# Altium integrated library Altium_Library_Harish.IntLib: 425 symbols (part 2 of 4) (continued)
## IC_RS512M32LZ4D2ANP-75BT (continued)

## IC_RTL8211E-VB-CG
designator U?, comment RTL8211E-VB-CG
Ethernet Transceivers 10/100/1000 Base-T PHY GMII, MII, RGMII 1.43V ~ 3.63V QFN-48_6x6x04P Ethernet ICs RoHS; Manufacturer: Realtek Semicon; Manufacturer Part Number: RTL8211E-VB-CG; Case/Package: QFN-48; Supplier-1: LCSC
footprint QFN48_19.6_324X324_SMD (QFN Package)
pins: 1 MDI0_P, 2 MDI0_N, 3 AVDD10_1, 4 MDI1_P, 5 MDI1_N, 6 AVDD33_1, 7 MDI2_P, 8 MDI2_N, 9 AVDD10_2, 10 MDI3_P, 11 MD3_N, 12 NC1, 13 RXCTL/PHY_AD2, 14 RXD0/SELRGV, 15 DVDD33_1, 16 RXD1/TXDLY, 17 RXD2/AIN0, 18 RXD3/AIN1, 19 RXC, 20 INT, 21 DVDD33_2, 22 TXC, 23 TXD0, 24 TXD1, 25 TXD2, 26 TXD3, 27 TXCTL, 28 DVDD10_2, 29 PHY_NRST, 30 MDC, 31 MDIO, 32 LED2/RXDLY, 33 PME, 34 LED0/PHY_AD0, 35 LED1/PHY_AD1, 36 DVDD10_1, 37 DVDD33_3, 38 ENSWREG, 39 RSET, 40 AVDD10_3, 41 AVDD33_2, 42 CKXTAL1, 43 CKXTAL2, 44 VDDREG_1, 45 VDDREG_2, 46 CLK125, 47 GND1, 48 REG_OUT, 49 EXPAD1

## IC_S32K116_MCU
designator U?, comment FS32K116LAT0MLFT
MCU 32-Bit S32K116 ARM Cortex-M0+ RISC 128KB Flash 2.7V to 5.5V 48-Pin LQFP Tray; Manufacturer: NXP Semiconductors; Supplier 1: Digi-Key; Manufacturer Part Number: FS32K116LAT0MLFT; RoHS: Yes; Category: Microcontrollers; Stock 1: 1; Pricing 1: 1=23.54, 10=18.877, 80=16.11963, 500=15.9075 (USD); Supplier Part Number 1: 568-14729-ND
footprint S32K116_48PIN
pins: 1 PTD1, 2 PTD0, 3 PTE5, 4 PTE4, 5 VDD5, 6 VDDA, 7 VSS7, 8 PTB7, 9 PTB6, 10 PTD16, 11 PTD15, 12 PTE9, 13 PTE8, 14 PTB5, 15 PTB4, 16 PTC3, 17 PTC2, 18 PTD5, 19 PTC1, 20 PTC16, 21 PTC15, 22 PTC14, 23 PTB3, 24 PTB2, 25 PTB1, 26 PTB0, 27 PTC9, 28 PTC8, 29 PTA7, 30 VSS30, 31 VDD31, 32 PTB13, 33 PTD3, 34 PTD2, 35 PTA3, 36 PTA2, 37 PTA1, 38 PTA0, 39 PTC7, 40 PTC6, 41 PTA13, 42 PTA12, 43 PTA11, 44 PTA10, 45 PTC5, 46 PTC4, 47 PTA5, 48 PTA4
text: S32K116

## IC_S32K144_MCU
designator U?
footprint LQFP_64 (S32K144 0.5mm Pitch)
pins: 1 PTD1, 2 PTD0, 3 PTE11, 4 PTE10, 5 PTE5, 6 PTE4, 7 VDD, 8 VDDA, 9 VREFH, 10 VSS, 11 PTB7, 12 PTB6, 13 PTE3, 14 PTD16, 15 PTD15, 16 PTE9, 17 PTE8, 18 PTB5, 19 PTB4, 20 PTC3, 21 PTC2, 22 PTD7, 23 PTD6, 24 PTD5, 25 PTC1, 26 PTC0, 27 PTC17, 28 PTC16, 29 PTC15, 30 PTC14, 31 PTB3, 32 PTB2, 33 PTB1, 34 PTB0, 35 PTC9, 36 PTC8, 37 PTA7, 38 PTA6, 39 PTE7, 40 VSS, 41 VDD, 42 PTB13, 43 PTB12, 44 PTD4, 45 PTD3, 46 PTD2, 47 PTA3, 48 PTA2, 49 PTA1, 50 PTA0, 51 PTC7, 52 PTC6, 53 PTE6, 54 PTE2, 55 PTA13, 56 PTA12, 57 PTA11, 58 PTA10, 59 PTE1, 60 PTE0, 61 PTC5, 62 PTC4, 63 PTA5, 64 PTA4
text: S32K144

## IC_SN74HCT14 SChmit-Trigger Inverter 6 Channel 16TSSOP
designator U?  (value not drawn)
IC INV SCHMITT 6CH 1-IN 14SOIC
footprint SO-14_1.27 IC SN74HCT14
pins: 1 1A "Channel 1 Input", 2 1Y "Channel 1 Output", 3 2A "Channel 2 Input", 4 2Y "Channel 2 Output", 5 3A "Channel 3 Input", 6 3Y "Channel 3 Output", 7 GND "Ground", 8 4Y "Channel 4 Output", 9 4A "Channel 4 Input", 10 5Y "Channel 5 Output", 11 5A "Channel 5 Input", 12 6Y "Channel 6 Output", 13 6A "Channel 6 Input", 14 VCC "Power Supply"
text: SN74HCT14

## IC_SOC_40QN40K15050_0.4mm-Pitch_QFN40
designator SC?, comment 40QN40S15050
Plastronics IC Test & Burn-In Socket, For QFN40, MLP40, MLF40 Package; Manufacturer: Plastronics; ComponentLink1Description: Purchase link; ComponentLink1URL: https://www.waveshare.com/40qn40s15050.htm
footprint IC_SOCKET_QFN40_40QN40K15050 (Socket Programming QFN40)
pins: 1 WDI, 2 SDA, 3 SCL, 4 VDDIO, 5 VDDOTP, 6 PWRON, 7 STANDBY, 8 ONKEY, 9 INTB, 10 RESETBMCU, 11 VLDO3IN, 12 VLDO3, 13 SW3LX, 14 SW3IN, 15 SW3FB, 16 SW2FB, 17 SW2IN, 18 SW2LX, 19 VLDO2, 20 VLDO2IN, 21 VREFDDR, 22 VINREFDDR, 23 VDIG, 24 VCORE, 25 SW1LX, 26 SW1IN, 27 SW1FB, 28 VLDO1IN, 29 VLDO1, 30 VSNVS, 31 LICELL, 32 THM, 33 VBATT1, 34 VBATT2, 35 VSYS1, 36 VSYS2, 37 VBUSIN, 38 INT2P7, 39 USBPHY, 40 CHGB, 41 PAD
text: PF1550 Socket

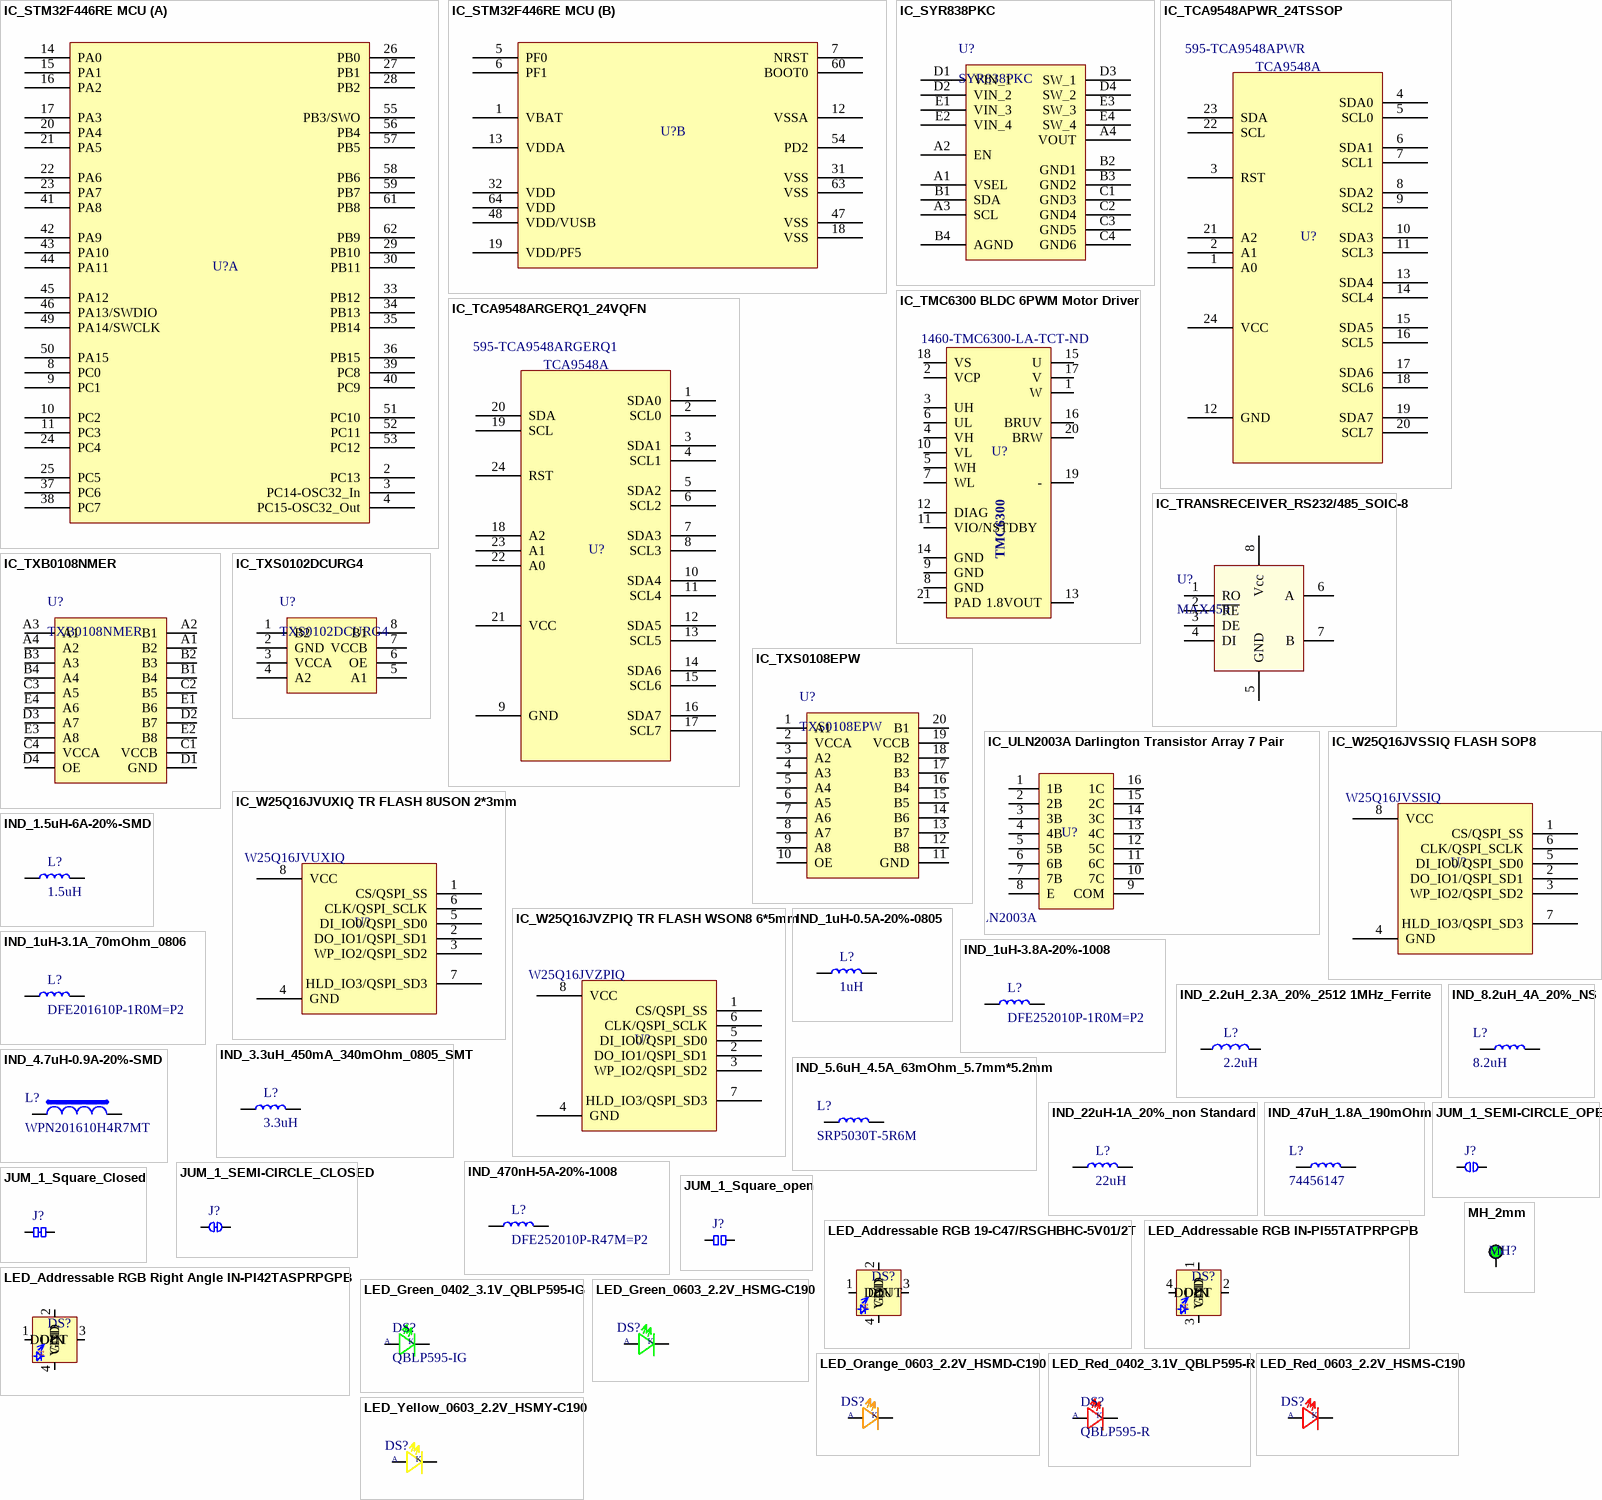
[diagram p10: symbols IC_STM32F446RE MCU to MH_2mm]

## IC_STM32F446RE MCU
designator U?  (value not drawn)
ARM® Cortex®-M4 STM32 F4 Microcontroller IC 32-Bit 180MHz 512KB (512K x 8) FLASH 64-LQFP (10x10)
part A pins: 2 PC13, 3 PC14-OSC32_In, 4 PC15-OSC32_Out, 8 PC0, 9 PC1, 10 PC2, 11 PC3, 14 PA0, 15 PA1, 16 PA2, 17 PA3, 20 PA4, 21 PA5, 22 PA6, 23 PA7, 24 PC4, 25 PC5, 26 PB0, 27 PB1, 28 PB2, 29 PB10, 30 PB11, 33 PB12, 34 PB13, 35 PB14, 36 PB15, 37 PC6, 38 PC7, 39 PC8, 40 PC9, 41 PA8, 42 PA9, 43 PA10, 44 PA11, 45 PA12, 46 PA13/SWDIO, 49 PA14/SWCLK, 50 PA15, 51 PC10, 52 PC11, 53 PC12, 55 PB3/SWO, 56 PB4, 57 PB5, 58 PB6, 59 PB7, 61 PB8, 62 PB9
part B pins: 1 VBAT, 5 PF0, 6 PF1, 7 NRST, 12 VSSA, 13 VDDA, 18 VSS, 19 VDD/PF5, 31 VSS, 32 VDD, 47 VSS, 48 VDD/VUSB, 54 PD2, 60 BOOT0, 63 VSS, 64 VDD

## IC_SYR838PKC
designator U?, comment SYR838PKC
Step-Down Positive Programmable 1 6A 2.4MHz CSP1.56*1.96-20 DC-DC Converters RoHS; Manufacturer: Silergy Corp; Manufacturer Part Number: SYR838PKC; Case/Package: CSP1.56*1.96-20; Supplier-1: LCSC
footprint CSP20_15.7_100x84_SMD (CSP Package)
pins: A1 VSEL, A2 EN, A3 SCL, A4 VOUT, B1 SDA, B2 GND1, B3 GND2, B4 AGND, C1 GND3, C2 GND4, C3 GND5, C4 GND6, D1 VIN_1, D2 VIN_2, D3 SW_1, D4 SW_2, E1 VIN_3, E2 VIN_4, E3 SW_3, E4 SW_4

## IC_TCA9548APWR_24TSSOP
designator U?  Supplier Part Number 1: 595-TCA9548APWR  (hidden comment: *)
IC I2C SW 8CH W/RESET 24TSSOP; Manufacturer: Texas Instruments; Manufacturer Part Number: TCA9548APWR; Max Supply Voltage: 5.5V; Min Supply Voltage: 1.65V; Max Supply Current: 80uA; Supply Type: Single; Independent Circuits: 1; Supplier 1: Mouser; RoHS: Yes; Category: Decoders and Multiplexers; Stock 1: 37474; Pricing 1: 1=1.63, 10=1.46, 50=1.46, 100=1.14, 1000=0.742, 10000=0.638 (USD); Mount: Surface Mount; Case/Package: TSSOP; Number of Pins: 24; Min Operating Temperature: -40°C; Max Operating Temperature: 85°C; Packaging: Tape and Reel; Package Quantity: 2000; Series: TCA; Reach SVHC Compliant: No; Lead Free: Lead Free; RoHS Compliant: Yes; ComponentLink1URL: https://datasheet.ciiva.com/6614/tca9548a-6614721.pdf?src-supplier=Digi-Key; ComponentLink1Description: https://datasheet.ciiva.com/6614/tca9548a-6614721.pdf?src-supplier=Digi-Key
pins: 1 A0, 2 A1, 3 RST, 4 SDA0, 5 SCL0, 6 SDA1, 7 SCL1, 8 SDA2, 9 SCL2, 10 SDA3, 11 SCL3, 12 GND, 13 SDA4, 14 SCL4, 15 SDA5, 16 SCL5, 17 SDA6, 18 SCL6, 19 SDA7, 20 SCL7, 21 A2, 22 SCL, 23 SDA, 24 VCC
text: TCA9548A

## IC_TCA9548ARGERQ1_24VQFN
designator U?  Supplier Part Number 1: 595-TCA9548ARGERQ1  (hidden comment: *)
I2C Switch with Reset 8 Channel Bi-Directional 1.65V to 5.25V 24-Pin VQFN Cut Tape; Manufacturer: Texas Instruments; Manufacturer Part Number: TCA9548ARGERQ1; Supplier 1: Mouser; RoHS: Yes; Category: Decoders and Multiplexers; Stock 1: 161025; Pricing 1: 1=2.33, 10=2, 50=2, 100=1.6, 1000=1.15, 10000=1.02 (USD); ComponentLink1URL: http://www.ti.com/general/docs/suppproductinfo.tsp?distId=10&amp;gotoUrl=http%3A%2F%2Fwww.ti.com%2Flit%2Fgpn%2Ftca9548a-q1&src-supplier=Digi-Key; ComponentLink1Description: http://www.ti.com/general/docs/suppproductinfo.tsp?distId=10&amp;gotoUrl=http%3A%2F%2Fwww.ti.com%2Flit%2Fgpn%2Ftca9548a-q1&src-supplier=Digi-Key
pins: 1 SDA0, 2 SCL0, 3 SDA1, 4 SCL1, 5 SDA2, 6 SCL2, 7 SDA3, 8 SCL3, 9 GND, 10 SDA4, 11 SCL4, 12 SDA5, 13 SCL5, 14 SDA6, 15 SCL6, 16 SDA7, 17 SCL7, 18 A2, 19 SCL, 20 SDA, 21 VCC, 22 A0, 23 A1, 24 RST
text: TCA9548A

## IC_TMC6300 BLDC 6PWM Motor Driver
designator U?  Supplier Part Number 1: 1460-TMC6300-LA-TCT-ND  (hidden comment: *)
BLDC Motor Driver IC, 2.0A, 2...11V, QFN-20; Manufacturer: Trinamic; Manufacturer Part Number: TMC6300-LA-T; Supplier 1: Digi-Key; RoHS: No; Stock 1: 4327; Pricing 1: 1=2.56, 10=2.303, 25=2.1728, 100=1.8514, 250=1.7384, 500=1.5211, 1000=1.26034, 2500=1.23 (USD)
footprint QFN20_0.4mm 5x5 TMC6300
pins: 1 W, 2 VCP, 3 UH, 4 VH, 5 WH, 6 UL, 7 WL, 8 GND, 9 GND, 10 VL, 11 VIO/NSTDBY, 12 DIAG, 13 1.8VOUT, 14 GND, 15 U, 16 BRUV, 17 V, 18 VS, 19 -, 20 BRW, 21 PAD
text: TMC6300

## IC_TRANSRECEIVER_RS232/485_SOIC-8
designator U?, comment MAX458
1/1 Transceiver Half RS422, RS485 8-SOIC; Manufacturer: Maxim; Manufacturer Part Number: MAX485ESA+T; Number of Receivers: 1; Operating Supply Voltage: 5V; Data Rate: 2.5Mbps; Interface: RS-422,RS-485; Min Supply Voltage: 4.75V; Max Supply Voltage: 5.25V; Simplex/Duplex: Half Duplex; Supply Current: 500uA; Supplier 1: Digikey; RoHS: Yes; Category: RS-232 / RS-422 / RS-485 Interface ICs; Stock 1: 3430; Pricing 1: 1=5.6, 10=5.033, 25=4.758, 100=4.1235, 250=3.91208, 500=3.5103, 1000=2.96049 (USD); Mount: Surface Mount; Case/Package: SOIC; Number of Pins: 8; Min Operating Temperature: 0°C; Max Operating Temperature: 70°C; Packaging: Tape and Reel; Package Quantity: 1; Number of Transmitters: 1; Logic Function: Transceiver; Number of Drivers: 1; Number of Transceivers: 1; Series: -; Length: 5mm; Width: 4mm; Height: 1.5mm; Lead Free: Lead Free; RoHS Compliant: Yes; Reach SVHC Compliant: Unknown; ComponentLink1URL: https://datasheet.ciiva.com/22828/0900766b810e2699-22828311.pdf?src-supplier=Rs; ComponentLink1Description: https://datasheet.ciiva.com/22828/0900766b810e2699-22828311.pdf?src-supplier=Rs; ComponentLink2URL: https://datasheet.ciiva.com/12260/max1487-max491-96074-12260683.pdf?src-supplier=Mouser; ComponentLink2Description: https://datasheet.ciiva.com/12260/max1487-max491-96074-12260683.pdf?src-supplier=Mouser; ComponentLink3URL: https://datasheet.ciiva.com/14430/max1487-max491-14430326.pdf?src-supplier=Avnet; ComponentLink3Description: https://datasheet.ciiva.com/14430/max1487-max491-14430326.pdf?src-supplier=Avnet; ComponentLink4URL: https://datasheet.ciiva.com/14084/max1487-max491-14084901.pdf?src-supplier=Digikey; ComponentLink4Description: https://datasheet.ciiva.com/14084/max1487-max491-14084901.pdf?src-supplier=Digikey; Supplier Part Number 1: MAX485ESA+TCT-ND
footprint SOIC8 (LV14360)
pins: 1 RO, 2 ~{RE}, 3 DE, 4 DI, 5 GND, 6 A, 7 B, 8 Vcc

## IC_TXB0108NMER
designator U?, comment TXB0108NMER
Translation - Voltage Levels 8-Bit Bidirectional Voltage-Level Shifter with Auto Direction Sensing and +/-15-kV ESD Protect; Manufacturer: Texas Instruments; Manufacturer Part Number: TXB0108NMER; Case/Package: NFBGA-20; Supplier-1: Mouser
footprint NFBGA_31.4_125.9X102.36 (BGA, 20-Leads, Body 3.00x2.50mmx0.80mm, Pitch 0.50mm)
pins: A1 B2, A2 B1, A3 A1, A4 A2, B1 B4, B2 B3, B3 A3, B4 A4, C1 VCCB, C2 B5, C3 A5, C4 VCCA, D1 GND, D2 B7, D3 A7, D4 OE, E1 B6, E2 B8, E3 A8, E4 A6

## IC_TXS0102DCURG4
designator U?, comment TXS0102DCURG4
Voltage Level Translator Bidirectional 1 Circuit 2 Channel 24Mbps 8-VSSOP; Manufacturer: Texas Instruments; Manufacturer Part Number: TXS0102DCURG4; Case/Package: VSSOP8; Supplier-1: Mouser
footprint VSSOP-8_19.6_157_33X11_SMD (VSSOP)
pins: 1 B2, 2 GND, 3 VCCA, 4 A2, 5 A1, 6 OE, 7 VCCB, 8 B1

## IC_TXS0108EPW
designator U?, comment TXS0108EPW
TXS0108E 8-Bit Bi-directional, Level-Shifting, Voltage Translator / for Open-Drain and Push-Pull Applications; Manufacturer: Texas Instruments; Alternate Part Number-1: NA; Manufacturer Part Number: TXS0108EPW; Case/Package: TSSOP-20; Supplier-1: Mouser; Supplier Part Number-1: 595-TXS0108EPWRG4; Category: Integrated Circuit; Number of Pins: 20
footprint TSSOP20_25-59_292_12X65_SMT (Footprint not found)
pins: 1 A1, 2 VCCA, 3 A2, 4 A3, 5 A4, 6 A5, 7 A6, 8 A7, 9 A8, 10 OE, 11 GND, 12 B8, 13 B7, 14 B6, 15 B5, 16 B4, 17 B3, 18 B2, 19 VCCB, 20 B1

## IC_ULN2003A Darlington Transistor Array 7 Pair
designator U?  (value not drawn)
IC PWR RELAY 7NPN 1:1 16SO
footprint SO-16_1.27 IC ULN200xA
pins: 1 1B "Input Pair 1", 2 2B "Input Pair 2", 3 3B "Input Pair 3", 4 4B "Input Pair 4", 5 5B "Input Pair 5", 6 6B "Input Pair 6", 7 7B "Input Pair 7", 8 E "Common Emitter (Ground)", 9 COM "Common Clamp Diodes", 10 7C "Output Pair 7", 11 6C "Output Pair 6", 12 5C "Output Pair 5", 13 4C "Output Pair 4", 14 3C "Output Pair 3", 15 2C "Output Pair 2", 16 1C "Output Pair 1"
text: ULN2003A

## IC_W25Q16JVSSIQ FLASH SOP8
designator U?  (value not drawn)
ICFLASH16MBIT133MHZ8SOIC; Manufacturer: Winbond; Manufacturer Part Number: W25Q16JVSSIQ; Memory Type: Non-Volatile,FLASH; Memory Size: 16Mb; Frequency: 133MHz; Supplier 1: Digi-Key; RoHS: Yes; Category: Flash; Stock 1: 347069; Pricing 1: 1=0.5, 25=0.4528, 100=0.3959, 2500=0.37926, 10000=0.34104 (USD); Mount: Surface Mount; Case/Package: SOIC; Min Operating Temperature: -40°C; Max Operating Temperature: 85°C; Packaging: Rail/Tube; Series: SpiFlash®; RoHS Compliant: Yes; ComponentLink1URL: http://www.winbond.com/resource-files/w25q16jv%20spi%20revg%2003222018%20plus.pdf?src-supplier=Digi-Key; ComponentLink1Description: http://www.winbond.com/resource-files/w25q16jv%20spi%20revg%2003222018%20plus.pdf?src-supplier=Digi-Key
footprint SOP8_flash
pins: 1 CS/QSPI_SS, 2 DO_IO1/QSPI_SD1, 3 WP_IO2/QSPI_SD2, 4 GND, 5 DI_IO0/QSPI_SD0, 6 CLK/QSPI_SCLK, 7 HLD_IO3/QSPI_SD3, 8 VCC

## IC_W25Q16JVUXIQ TR FLASH 8USON 2*3mm
designator U?  (value not drawn)
NOR Flash Serial (SPI, Dual SPI, Quad SPI) 3V/3.3V 16M-bit 2M x 8 6ns 8-Pin USON EP T/R; Manufacturer 1: Winbond; Manufacturer Part Number 1: W25Q16JVUXIQ TR; Supplier 1: Digi-Key; RoHS: No; Category: Memory; Stock 1: 22409; Pricing 1: 1=0.56, 10=0.51, 25=0.504, 50=0.501, 100=0.4479, 250=0.44416, 500=0.43758, 1000=0.42193 (USD); Supplier Part Number 1: 256-W25Q16JVUXIQTRCT-ND
footprint USON8 2*3mm
pins: 1 CS/QSPI_SS, 2 DO_IO1/QSPI_SD1, 3 WP_IO2/QSPI_SD2, 4 GND, 5 DI_IO0/QSPI_SD0, 6 CLK/QSPI_SCLK, 7 HLD_IO3/QSPI_SD3, 8 VCC
text: W25Q16JVUXIQ

## IC_W25Q16JVZPIQ TR FLASH WSON8 6*5mm
designator U?  (value not drawn)
NOR Flash Serial-SPI 3V/3.3V 16M-bit 6ns 8-Pin WSON EP Tube | IC FLASH 16M SPI 133MHZ 8WSON; Manufacturer: Winbond; Manufacturer Part Number: W25Q16JVZPIQ; Memory Type: Non-Volatile,FLASH; Memory Size: 16Mb; Supplier 1: Rs; RoHS: Yes; Category: Flash; Stock 1: 1; Mount: Surface Mount; Min Operating Temperature: -40°C; Max Operating Temperature: 85°C; Packaging: Rail/Tube; Frequency: 133MHz; Series: SpiFlash®; RoHS Compliant: Yes; ComponentLink1URL: http://www.winbond.com/resource-files/w25q16jv%20spi%20revg%2003222018%20plus.pdf?src-supplier=Digi-Key; ComponentLink1Description: http://www.winbond.com/resource-files/w25q16jv%20spi%20revg%2003222018%20plus.pdf?src-supplier=Digi-Key
footprint WSON8 6*5mm 8 PAD
pins: 1 CS/QSPI_SS, 2 DO_IO1/QSPI_SD1, 3 WP_IO2/QSPI_SD2, 4 GND, 5 DI_IO0/QSPI_SD0, 6 CLK/QSPI_SCLK, 7 HLD_IO3/QSPI_SD3, 8 VCC

## IND_1.5uH-6A-20%-SMD
designator L?, comment 1.5uH
WPN4020H1R5MT / Wire Wound SMD Power Inductors – WPN Series / Operating Temp. : -40℃~+125℃ (Including self-heating) /; Manufacturer: Sunlord; Mnaufcaturer Part Number: WPN4020H1R5MT; Case/Package: SMD; Supplier-1: NA
pins: 1, 2 1

## IND_1uH-0.5A-20%-0805
designator L?, comment 1uH
1uH ±20% 500mA 150mΩ 0805 Inductors (SMD) RoHS /; Manufacturer: Taiyo Yuden; Manufacturer Part Number: CB2012T1R0M; Case/Package: 0805; Supplier-1: LCSC
pins: 1, 2 1

## IND_1uH-3.1A_70mOhm_0806
designator L?, comment DFE201610P-1R0M=P2
Inductor Power Shielded Wirewound 1uH 20% 1MHz Metal 2.2A 0.07Ohm DCR 0806 T/R; Manufacturer: Murata Electronics; Manufacturer 1: Murata; Core Material: Ferrite; Current Rating: 3.1A; DC Resistance (DCR): 70mR; Manufacturer Part Number: DFE201610P-1R0M=P2; Case/Package: 0806; Supplier-1: Digikey; Supplier 1: Digi-Key; Manufacturer Part Number 1: DFE201610P-1R0M=P2; RoHS: Yes; Category: Fixed Inductors; Stock 1: 7236; Pricing 1: 1=0.31, 10=0.275, 25=0.2404, 50=0.206, 100=0.1889, 250=0.17172, 500=0.16142, 1000=0.12364 (USD); Mount: Surface Mount; Case Code (Metric): 2016; Case Code (Imperial): 0806; Min Operating Temperature: -40°C; Max Operating Temperature: 125°C; Inductance: 1uH; Packaging: Cut Tape; Shielding: Shielded; Test Frequency: 1MHz; Max DC Current: 2.2A; Tolerance: 20%; Series: DFE201610P; Length: 0.079inch; Width: 0.063inch; Height - Seated (Max): 0.039inch; Depth: 1.6mm; RoHS Compliant: Yes; ComponentLink1URL: http://www.farnell.com/datasheets/2550117.pdf?src-supplier=Farnell; ComponentLink1Description: http://www.farnell.com/datasheets/2550117.pdf?src-supplier=Farnell; ComponentLink2URL: https://datasheet.octopart.com/DFE201610P-1R0M%3DP2-Murata-datasheet-62290036.pdf?src-supplier=Element14; ComponentLink2Description: https://datasheet.octopart.com/DFE201610P-1R0M%3DP2-Murata-datasheet-62290036.pdf?src-supplier=Element14; ComponentLink3URL: https://www.murata.com/~/media/webrenewal/products/inductor/chip/tokoproducts/wirewoundmetalalloychiptype/m_dfe201610p.ashx?src-supplier=Digi-Key; ComponentLink3Description: https://www.murata.com/~/media/webrenewal/products/inductor/chip/tokoproducts/wirewoundmetalalloychiptype/m_dfe201610p.ashx?src-supplier=Digi-Key; ComponentLink4URL: http://www.murata.com/~/media/webrenewal/products/inductor/chip/tokoproducts/wirewoundmetalalloychiptype/m_dfe201610p.ashx?src-supplier=Digi-Key; ComponentLink4Description: http://www.murata.com/~/media/webrenewal/products/inductor/chip/tokoproducts/wirewoundmetalalloychiptype/m_dfe201610p.ashx?src-supplier=Digi-Key; ComponentLink5URL: http://www.toko.co.jp/products/pdf/inductors/dfe201610p.pdf?src-supplier=Avnet; ComponentLink5Description: http://www.toko.co.jp/products/pdf/inductors/dfe201610p.pdf?src-supplier=Avnet; Supplier Part Number 1: 490-10607-1-ND
footprint IND_0806 (M2016)
pins: 1, 2 1

## IND_1uH-3.8A-20%-1008
designator L?, comment DFE252010P-1R0M=P2
1µH Shielded Wirewound Inductor 3.8A 54mOhm Max 1008 (2520 Metric) /; Manufacturer: Murata Electronics; Manufacturer Part Number: DFE252010P-1R0M=P2; Case/Package: 1008; Supplier-1: Digikey
pins: 1, 2 1

## IND_2.2uH_2.3A_20%_2512 1MHz_Ferrite
designator L?, comment 2.2uH
Ind Power Semi-Shielded Wirewound 2.2uH 20% 1MHz Ferrite 2.3A 2512 T/R; Manufacturer: Bourns; Manufacturer Part Number: SRN2512-2R2M; Saturation Current: 2.7A; Shielding: Unshielded; DC Resistance (DCR): 102mR; Self Resonant Frequency: 80MHz; Supplier 1: Rs; RoHS: Yes; Category: Fixed Inductors; Stock 1: 1; Mount: Surface Mount; Case/Package: 1008; Core Material: Ferrite; Case Code (Metric): 2520; Case Code (Imperial): 1008; Min Operating Temperature: -55°C; Max Operating Temperature: 125°C; Inductance Tolerance: 20%; Packaging: Cut Tape; Tolerance: 20%; Inductance: 2.2uH; Current Rating: 2.3A; Test Frequency: 1MHz; Max DC Current: 2.3A; Termination: SMD/SMT; RMS Current (Irms): 2.3A; Series: SRN2512; Length: 0.098inch; Width: 0.079inch; Height: 1.2mm; Height - Seated (Max): 0.047inch; Depth: 2mm; Reach SVHC Compliant: No; RoHS Compliant: Yes; ComponentLink1URL: https://datasheet.ciiva.com/46437/1824802-46437414.pdf?src-supplier=Element14; ComponentLink1Description: https://datasheet.ciiva.com/46437/1824802-46437414.pdf?src-supplier=Element14; ComponentLink2URL: https://datasheet.ciiva.com/46437/1824802-46437415.pdf?src-supplier=Element14; ComponentLink2Description: https://datasheet.ciiva.com/46437/1824802-46437415.pdf?src-supplier=Element14; ComponentLink3URL: https://datasheet.ciiva.com/48684/srn2512-48684858.pdf?src-supplier=Avnet; ComponentLink3Description: https://datasheet.ciiva.com/48684/srn2512-48684858.pdf?src-supplier=Avnet
pins: 1, 2 1

## IND_3.3uH_450mA_340mOhm_0805_SMT
designator L?, comment 3.3uH
footprint IND_0805
pins: 1, 2 1

## IND_4.7uH-0.9A-20%-SMD
designator L?, comment WPN201610H4R7MT
4.7uH ±20% 900mA 425mΩ SMD,2.0x1.6x1.0mm Power Inductors RoHS /; Manufacturer: Sunlord; Manufacturer Part Number: WPN201610H4R7MT; Case/Package: SMD; Supplier-1: LCSC
footprint IND_62.9_110X86.6_SMD (Inductor)
pins: 1, 2

## IND_5.6uH_4.5A_63mOhm_5.7mm*5.2mm
designator L?, comment SRP5030T-5R6M
General Purpose Inductor, 5.6uH, 20%, 1 Element, Powdered Iron-Core, SMD, 2220; Manufacturer: Bourns; Core Material: Ferrite; DC Resistance (DCR): 63mR; Inductor Application: POWER INDUCTOR; Channels: 1; Max Current Rating: 4.25A; Shape/Size Description: RECTANGULAR PACKAGE; Shielding: Shielded; Test Frequency: 100kHz; Supplier: Digikey; Supplier Part Number: SRP5030T-5R6MCT-ND; Manufacturer Part Number: SRP5030T-5R6M; RoHS: Yes; Category: Fixed Inductors; Stock: 3265; Pricing: 1=1.36, 10=1.15, 25=1.0452, 50=0.9826, 100=0.8154, 250=0.75264, 500=0.71084, 1000=0.64812 (USD); Pins: 2; Terminal Finish: Tin; Min Operating Temperature: -40°C; Max Operating Temperature: 125°C; Tolerance: 20%; JESD-609 Code: e3; Inductance-Nom (L): 5.6uH; Inductor Type: GENERAL PURPOSE INDUCTOR; Surface Mount: Yes; Terminal Placement: Dual Ended; Termination: Wraparound; Reach SVHC Compliant: Yes; RoHS Compliant: Yes; ComponentLink1URL: https://datasheet.ciiva.com:443/pdfs/VipMasterIC/IC/BOUR/BOUR-S-A0006601856/BOUR-S-A0006601856-1.pdf?src-supplier=IHS+Markit; ComponentLink1Description: https://datasheet.ciiva.com:443/pdfs/VipMasterIC/IC/BOUR/BOUR-S-A0006601856/BOUR-S-A0006601856-1.pdf?src-supplier=IHS+Markit; ComponentLink2URL: https://datasheet.ciiva.com/17071/70281523-17071295.pdf?src-supplier=Allied+Electronics; ComponentLink2Description: https://datasheet.ciiva.com/17071/70281523-17071295.pdf?src-supplier=Allied+Electronics; ComponentLink3URL: https://datasheet.ciiva.com/28678/1698469-28678287.pdf?src-supplier=Element14; ComponentLink3Description: https://datasheet.ciiva.com/28678/1698469-28678287.pdf?src-supplier=Element14
footprint IND_6mm*6mm (SRP5030T-5R6M)
pins: 1, 2 1

## IND_8.2uH_4A_20%_NS
designator L?, comment 8.2uH
General Purpose Inductor, 8.2uH, 20%, 1 Element, Composite-Core, SMD, 2525; Manufacturer: Vishay Dale; Manufacturer Part Number: IHLP2525CZER8R2M01; Case/Size Code: 2525; DC Resistance (DCR): 68mR; Inductor Application: HIGH CURRENT INDUCTOR; Channels: 1; Max Current Rating: 4A; Shape/Size Description: RECTANGULAR PACKAGE; Shielding: Shielded; Test Frequency: 100kHz; Package Height: 3mm; Package Length: 6.86mm; Package Width: 6.47mm; Supplier: Digi-Key; Supplier Part Number: 541-1012-1-ND; RoHS: Yes; Category: Fixed Inductors; Stock: 34091; Pricing: 1=1.05, 10=0.887, 25=0.8064, 50=0.758, 100=0.6289, 250=0.58056, 500=0.5483, 1000=0.49991 (USD); Pins: 2; Core Material: Composite; Terminal Finish: Nickel; Min Operating Temperature: -55°C; Max Operating Temperature: 125°C; Tolerance: 20%; JESD-609 Code: e3; Construction: Shielded; Inductance-Nom (L): 8.2uH; Inductor Type: GENERAL PURPOSE INDUCTOR; Package Style: SMTMeter; Packaging: Tape and Reel; Surface Mount: Yes; Terminal Placement: Dual Ended; Termination: Wraparound; Reach SVHC Compliant: Yes; RoHS Compliant: Yes; ComponentLink1URL: https://datasheet.ciiva.com:443/pdfs/VipMasterIC/IC/VISH/VISH-S-A0003500153/VISH-S-A0003500153-1.pdf?src-supplier=IHS+Markit; ComponentLink1Description: https://datasheet.ciiva.com:443/pdfs/VipMasterIC/IC/VISH/VISH-S-A0003500153/VISH-S-A0003500153-1.pdf?src-supplier=IHS+Markit; ComponentLink2URL: https://datasheet.ciiva.com/11798/0900766b8102c934-11798421.pdf?src-supplier=Rs; ComponentLink2Description: https://datasheet.ciiva.com/11798/0900766b8102c934-11798421.pdf?src-supplier=Rs; ComponentLink3URL: https://datasheet.ciiva.com/3081/lp25cz01-3081990.pdf?src-supplier=Avnet; ComponentLink3Description: https://datasheet.ciiva.com/3081/lp25cz01-3081990.pdf?src-supplier=Avnet; ComponentLink4URL: https://datasheet.ciiva.com/16348/lp25cz01-16348924.pdf?src-supplier=Future+Electronics; ComponentLink4Description: https://datasheet.ciiva.com/16348/lp25cz01-16348924.pdf?src-supplier=Future+Electronics; ComponentLink5URL: https://datasheet.ciiva.com/8017/lp25cz01-8017605.pdf?src-supplier=Element14; ComponentLink5Description: https://datasheet.ciiva.com/8017/lp25cz01-8017605.pdf?src-supplier=Element14; ComponentLink6URL: https://datasheet.ciiva.com/46393/1913191-46393003.pdf?src-supplier=Element14; ComponentLink6Description: https://datasheet.ciiva.com/46393/1913191-46393003.pdf?src-supplier=Element14
pins: 1, 2 1

## IND_22uH-1A_20%_non Standard
designator L?, comment 22uH
General Purpose Inductor, 22uH, 20%, 1 Element, Nickel-zinc Ferrite-Core, SMD, 1816; Manufacturer: Wurth Electronics; Manufacturer Part Number: 744773122; Supplier 1: Rs; RoHS: Yes; Category: Fixed Inductors; Stock 1: 1; ComponentLink1URL: https://datasheet.ciiva.com/6700/744773122-6700341.pdf?src-supplier=Digi-Key; ComponentLink1Description: https://datasheet.ciiva.com/6700/744773122-6700341.pdf?src-supplier=Digi-Key; ComponentLink2URL: https://datasheet.ciiva.com/4954/744773122-30533-4954866.pdf?src-supplier=Mouser; ComponentLink2Description: https://datasheet.ciiva.com/4954/744773122-30533-4954866.pdf?src-supplier=Mouser; ComponentLink3URL: https://datasheet.ciiva.com/7892/1736335-7892856.pdf?src-supplier=Element14; ComponentLink3Description: https://datasheet.ciiva.com/7892/1736335-7892856.pdf?src-supplier=Element14; ComponentLink4URL: https://datasheet.ciiva.com/6700/744773122-6700343.pdf?src-supplier=Digi-Key; ComponentLink4Description: https://datasheet.ciiva.com/6700/744773122-6700343.pdf?src-supplier=Digi-Key; ComponentLink5URL: https://datasheet.ciiva.com/6700/744773122-6700345.pdf?src-supplier=Digi-Key; ComponentLink5Description: https://datasheet.ciiva.com/6700/744773122-6700345.pdf?src-supplier=Digi-Key; ComponentLink6URL: https://datasheet.ciiva.com/48690/001087838-da-01-ml-we-pd2-smd-speicherdrossel-s-744-de-en-48690549.pdf?src-supplier=Conrad; ComponentLink6Description: https://datasheet.ciiva.com/48690/001087838-da-01-ml-we-pd2-smd-speicherdrossel-s-744-de-en-48690549.pdf?src-supplier=Conrad
pins: 1, 2 1

## IND_47uH_1.8A_190mOhm
designator L?, comment 74456147
General Purpose Inductor, 47uH, 10%, 1 Element, Ferrite-Core, SMD, 5039; Manufacturer: Wurth Electronics; Case/Size Code: 5039; DC Resistance (DCR): 190mR; Inductor Application: POWER INDUCTOR; Channels: 1; Max Current Rating: 1.8A; Self Resonant Frequency: 12MHz; Shape/Size Description: RECTANGULAR PACKAGE; Shielding: Unshielded; Test Frequency: 100kHz; Package Height: 5mm; Package Length: 12.7mm; Package Width: 10mm; Supplier: Digikey; Supplier Part Number: 732-74456147CT-ND; Manufacturer Part Number: 74456147; RoHS: Yes; Category: Fixed Inductors; Stock: 2450; Pricing: 1=2.06, 10=1.97, 50=1.839, 100=1.708, 250=1.576 (USD); Pins: 2; Core Material: Ferrite; Terminal Finish: Copper; Min Operating Temperature: -40°C; Max Operating Temperature: 125°C; Tolerance: 10%; JESD-609 Code: e1; Construction: Unshielded; Inductance-Nom (L): 47uH; Inductor Type: GENERAL PURPOSE INDUCTOR; Package Style: SMTMeter; Packaging: Tape and Reel; Surface Mount: Yes; Terminal Placement: Dual Ended; Termination: One Surface; Reach SVHC Compliant: Yes; RoHS Compliant: Yes; ComponentLink1URL: https://datasheet.ciiva.com:443/pdfs/VipMasterIC/IC/MIDC/MIDC-S-A0001528382/MIDC-S-A0001527892-1.pdf?src-supplier=IHS+Markit; ComponentLink1Description: https://datasheet.ciiva.com:443/pdfs/VipMasterIC/IC/MIDC/MIDC-S-A0001528382/MIDC-S-A0001527892-1.pdf?src-supplier=IHS+Markit; ComponentLink2URL: https://datasheet.ciiva.com/1051/74456147-1051938.pdf?src-supplier=Digikey; ComponentLink2Description: https://datasheet.ciiva.com/1051/74456147-1051938.pdf?src-supplier=Digikey; ComponentLink3URL: https://datasheet.ciiva.com/11800/0900766b80bbd134-11800112.pdf?src-supplier=Rs; ComponentLink3Description: https://datasheet.ciiva.com/11800/0900766b80bbd134-11800112.pdf?src-supplier=Rs; ComponentLink4URL: https://datasheet.ciiva.com/7754/1735994-7754532.pdf?src-supplier=Element14; ComponentLink4Description: https://datasheet.ciiva.com/7754/1735994-7754532.pdf?src-supplier=Element14; ComponentLink5URL: https://datasheet.ciiva.com/7265/70054-7265056.pdf?src-supplier=Newark; ComponentLink5Description: https://datasheet.ciiva.com/7265/70054-7265056.pdf?src-supplier=Newark; ComponentLink6URL: https://datasheet.ciiva.com/1051/74456147-1051939.pdf?src-supplier=Digikey; ComponentLink6Description: https://datasheet.ciiva.com/1051/74456147-1051939.pdf?src-supplier=Digikey
footprint ind 14mm*14mm
pins: 1, 2 1

## IND_470nH-5A-20%-1008
designator L?, comment DFE252010P-R47M=P2
470nH Shielded Wirewound Inductor 5A 35mOhm Max 1008 (2520 Metric); Manufacturer: Murata Electronics; Manufacturer Part Number: DFE252010P-R47M=P2; Case/Package: 1008; Supplier-1: Digikey
pins: 1, 2 1

## JUM_1_SEMI-CIRCLE_CLOSED
designator J?  (value not drawn)  (net tie, no BOM)
Jumper - Short Circuit - Press Cut Open
footprint Jumper_Closed
pins: 1, 2

## JUM_1_SEMI-CIRCLE_OPEN
designator J?  (value not drawn)  (net tie, no BOM)
Jumper - Open Circuit - Solder to Close
footprint Jumper_Open
pins: 1, 2

## JUM_1_Square_Closed
designator J?  (value not drawn)  (net tie, no BOM)
footprint Jumper_square_Closed
pins: 1, 2

## JUM_1_Square_open
designator J?  (value not drawn)  (net tie, no BOM)
footprint Jumper_Square_Open
pins: 1, 2

## LED_Addressable RGB 19-C47/RSGHBHC-5V01/2T
designator DS?  (value not drawn)
LED Multi-Color Chip Brilliant Red/Blue/Brilliant Green 632nm/468nm/518nm 4-Pin Surface Mount T/R; Manufacturer: Everlight; Manufacturer Part Number: 19-C47/RSGHBHC-5V01/2T; Supplier 1: Digi-Key; RoHS: Yes; Category: LEDs; Stock 1: 328623; Pricing 1: 1=0.92, 10=0.597, 100=0.3914, 1000=0.309 (USD)
footprint LED_Addressable 19-C47/RSGHBHC-5V01/2T
pins: 1 DOUT, 2 VDD, 3 DIN, 4 GND
text: RGB; LED

## LED_Addressable RGB IN-PI55TATPRPGPB
designator DS?  (value not drawn)
5050 RGB LED 4-Pin with Integrated IC; Manufacturer: Inolux; Manufacturer Part Number: IN-PI55TATPRPGPB; Color: Blue,Green,Red; Interface: Serial; Number of LEDs: 1; Supplier 1: Digi-Key; RoHS: No; Category: LEDs; Stock 1: 26303; Pricing 1: 1=0.56, 10=0.368, 100=0.2436 (USD); Mount: Surface Mount; Packaging: Cut Tape; Series: -; Length: 5mm; Width: 5mm; ComponentLink1URL: http://www.inolux-corp.com/datasheet/SMDLED/Addressable%20LED/IN-PI55TAT(X)R(X)G(X)B_v1.1.pdf?src-supplier=Digi-Key; ComponentLink1Description: http://www.inolux-corp.com/datasheet/SMDLED/Addressable%20LED/IN-PI55TAT(X)R(X)G(X)B_v1.1.pdf?src-supplier=Digi-Key
footprint LED_Addressable IN-PI55TATPRPGPB (5.00mm L x 5.00mm W)
pins: 1 VDD, 2 DOUT, 3 GND, 4 DIN
text: RGB; LED

## LED_Addressable RGB Right Angle IN-PI42TASPRPGPB
designator DS?, comment IN-PI42TASPRPGPB  (value not drawn)
LED Tri-Color Blue/Green/Red 475nm/530nm/630nm; Manufacturer 1: Inolux; Color: Blue,Green,Red; Interface: Serial; Number of LEDs: 1; ComponentLink1URL: http://www.inolux-corp.com/datasheet/SMDLED/Addressable%20LED/IN-PI42TAS(X)R(X)G(X)B_v1.1.pdf?src-supplier=Digi-Key; ComponentLink1Description: http://www.inolux-corp.com/datasheet/SMDLED/Addressable%20LED/IN-PI42TAS(X)R(X)G(X)B_v1.1.pdf?src-supplier=Digi-Key; Supplier 1: Digi-Key; Manufacturer Part Number 1: IN-PI42TASPRPGPB; RoHS: No; Category: LEDs; Stock 1: 50264; Pricing 1: 1=0.72, 10=0.469, 100=0.307 (USD); Mount: Surface Mount; Packaging: Cut Tape; Series: -; Length: 4mm; Width: 1.5mm; Supplier Part Number 1: 1830-1206-1-ND
footprint LED_RIght-Angle_IN-PI42TASPRPGPB
pins: 1 DIN, 2 VDD, 3 DOUT, 4 GND
text: RGB; LED

## LED_Green_0402_3.1V_QBLP595-IG
designator DS?, comment QBLP595-IG
LED Uni-Color True Green 2-Pin Chip 0402(1006Metric) T/R; Manufacturer: QT-Brightek; Lens Color: Colorless; Lens Style: Flat; Lens Transparency: Clear; Luminous Intensity: 600mcd; Forward Voltage: 3.1V; Test Current: 20mA; Viewing Angle: 140°; Dominant Wavelength: 520nm; Lens Size: 0.5mm; Supplier 1: Digi-Key; Supplier Part Number 1: 1516-1216-1-ND; Manufacturer Part Number: QBLP595-IG; RoHS: Yes; Category: LEDs; Stock 1: 385550; Pricing 1: 1=0.39, 10=0.306, 100=0.1373, 500=0.12402, 1000=0.10187, 2000=0.08858 (USD); Mount: Surface Mount; Case/Package: 0402; Color: Green; Case Code (Imperial): 0402; Case Code (Metric): 1005; Packaging: Cut Tape; Series: QBLP595; Length: 1mm; Width: 0.5mm; Height: 0.6mm; RoHS Compliant: Yes; ComponentLink1URL: http://www.qt-brightek.com/datasheet/QBLP595 Series.pdf?src-supplier=Digi-Key; ComponentLink1Description: http://www.qt-brightek.com/datasheet/QBLP595 Series.pdf?src-supplier=Digi-Key
footprint LED_0402
pins: 1, 2
text: A; K

## LED_Green_0603_2.2V_HSMG-C190
designator DS?, comment HSMG-C190  (value not drawn)
Green 572nm LED Indication - Discrete 2.2V 0603 (1608 Metric); Manufacturer: Broadcom Avago; Supplier 1: Digi-Key; Supplier Part Number 1: 516-1425-1-ND; Manufacturer Part Number: HSMG-C190; RoHS: Yes; Category: LEDs; Stock 1: 262974; Pricing 1: 1=0.39, 10=0.254, 100=0.1696, 500=0.11732, 1000=0.09776, 2000=0.08799 (USD); ComponentLink1URL: https://datasheet.ciiva.com/15117/getdatasheetpartid-110413-15117483.pdf?src-supplier=Verical; ComponentLink1Description: https://datasheet.ciiva.com/15117/getdatasheetpartid-110413-15117483.pdf?src-supplier=Verical; ComponentLink2URL: https://datasheet.ciiva.com/11773/0900766b80ad69c9-11773861.pdf?src-supplier=Rs; ComponentLink2Description: https://datasheet.ciiva.com/11773/0900766b80ad69c9-11773861.pdf?src-supplier=Rs; ComponentLink3URL: https://datasheet.ciiva.com/31395/1487342-31395358.pdf?src-supplier=Farnell; ComponentLink3Description: https://datasheet.ciiva.com/31395/1487342-31395358.pdf?src-supplier=Farnell; ComponentLink4URL: https://datasheet.ciiva.com/29280/180659-da-01-en-chip-led-hsmg-c190-gelb-gruen-29280615.pdf?src-supplier=Conrad; ComponentLink4Description: https://datasheet.ciiva.com/29280/180659-da-01-en-chip-led-hsmg-c190-gelb-gruen-29280615.pdf?src-supplier=Conrad; ComponentLink5URL: https://datasheet.ciiva.com/14172/swseriehsmx-c150toc190-e-14172173.pdf?src-supplier=Distrelec; ComponentLink5Description: https://datasheet.ciiva.com/14172/swseriehsmx-c150toc190-e-14172173.pdf?src-supplier=Distrelec; ComponentLink6URL: https://datasheet.ciiva.com/46426/313031-46426519.pdf?src-supplier=Element14; ComponentLink6Description: https://datasheet.ciiva.com/46426/313031-46426519.pdf?src-supplier=Element14; ComponentLink7URL: https://datasheet.ciiva.com/46426/313031-46426520.pdf?src-supplier=Element14; ComponentLink7Description: https://datasheet.ciiva.com/46426/313031-46426520.pdf?src-supplier=Element14
footprint LED_0603 (Chip Capacitor 0603, 2-Leads, Body 1.68x0.88mm, IPC Medium Density)
pins: 1, 2
text: A; K
